# Altium footprint library connectors_socets.pcblib: 601 footprints (part 4 of 38)
Each footprint in its own frame and in the unit in brackets; x right, y up, seen from the top. Pads: shape width x height; smd on the part's side, far side on the other; paste and mask are expansions set on the pad; w line width, h text height; cw(c..) or ccw(c..) is an arc to the next point about the centre after c.
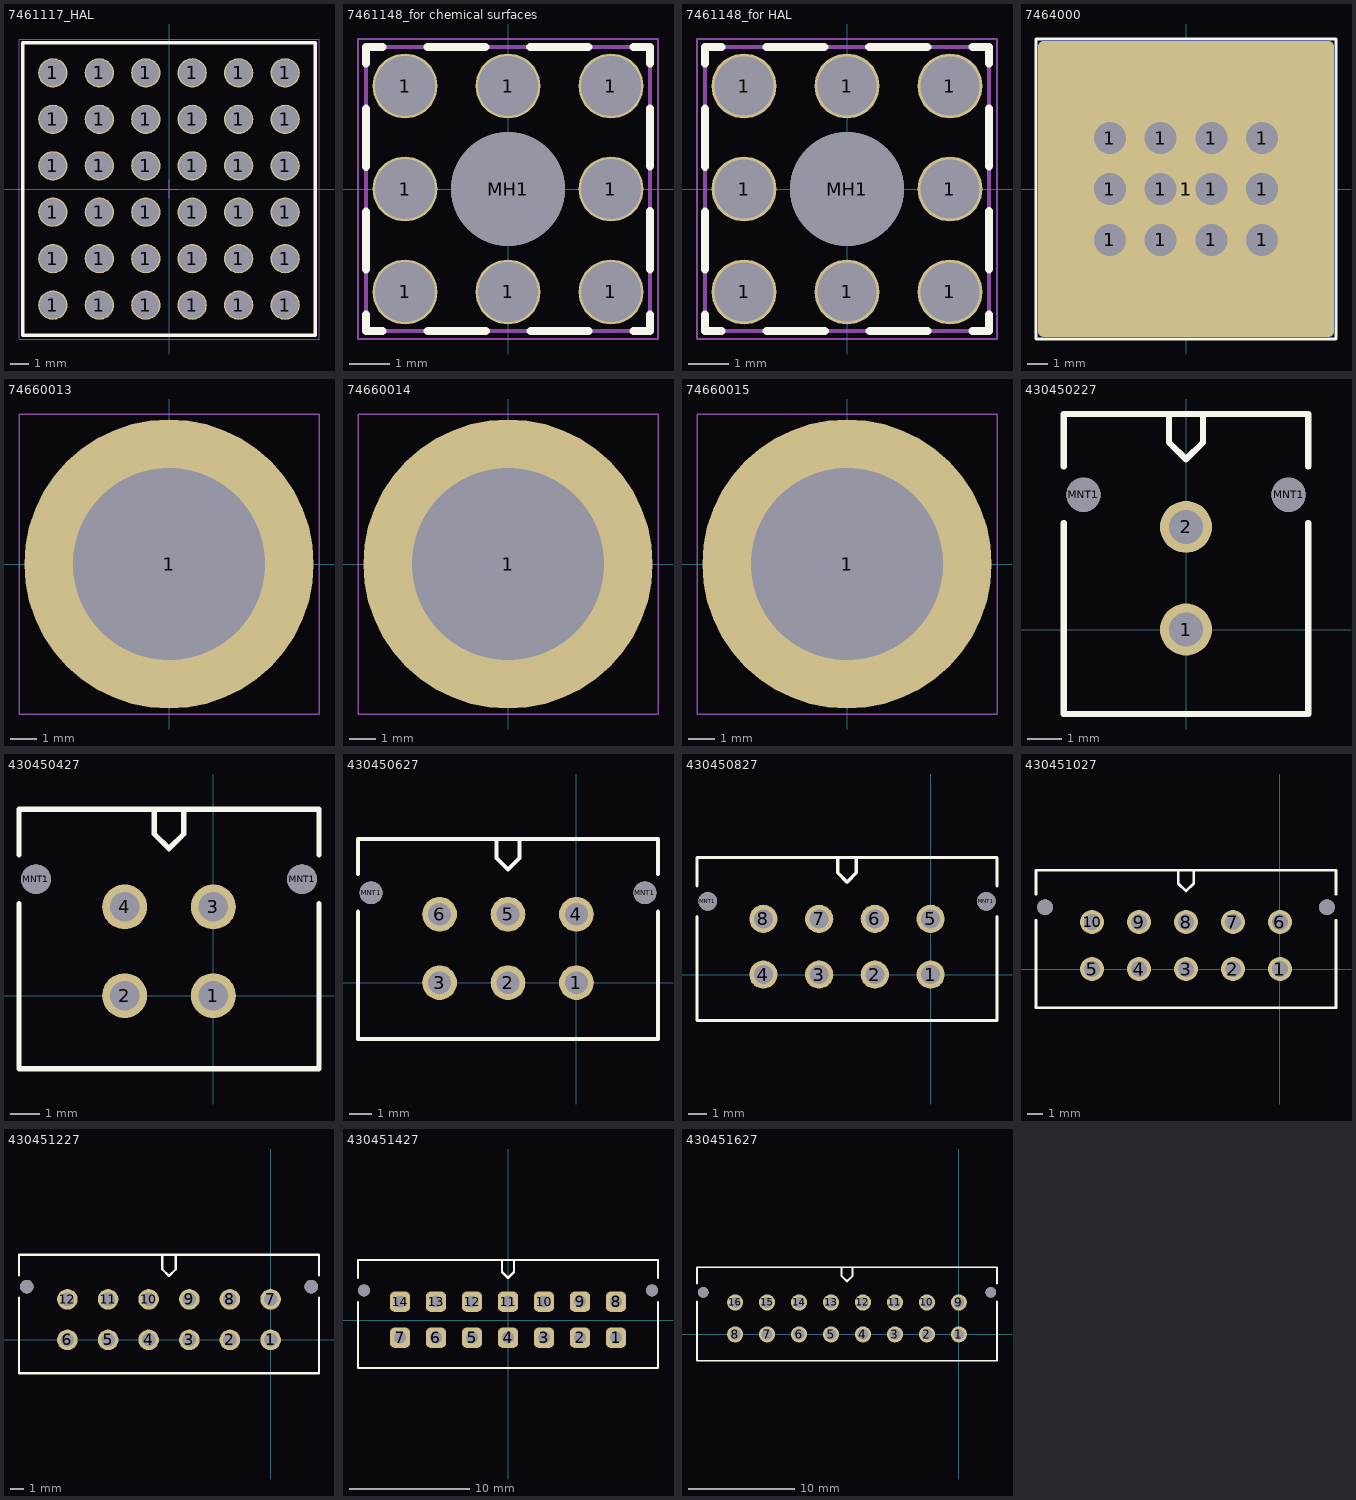
[diagram p3: the footprints below, top view; thin cyan lines are the x and y axes]

## 7461117_HAL [mm] "M10, thr 10mm"
height 25
pads (36):
  round 1.6 hole 1.45: 1(-6.35,-6.35) 1(-6.35,-3.81) 1(-6.35,-1.27) 1(-6.35,1.27) 1(-6.35,3.81) 1(-6.35,6.35) 1(-3.81,-6.35) 1(-3.81,-3.81) 1(-3.81,-1.27) 1(-3.81,1.27) 1(-3.81,3.81) 1(-3.81,6.35) 1(-1.27,-6.35) 1(-1.27,-3.81) 1(-1.27,-1.27) 1(-1.27,1.27) 1(-1.27,3.81) 1(-1.27,6.35) 1(1.27,-6.35) 1(1.27,-3.81) 1(1.27,-1.27) 1(1.27,1.27) 1(1.27,3.81) 1(1.27,6.35) 1(3.81,-6.35) 1(3.81,-3.81) 1(3.81,-1.27) 1(3.81,1.27) 1(3.81,3.81) 1(3.81,6.35) 1(6.35,-6.35) 1(6.35,-3.81) 1(6.35,-1.27) 1(6.35,1.27) 1(6.35,3.81) 1(6.35,6.35)
Top Overlay:
  lines w0.2: -8,-8 8,-8 8,8 -8,8 -8,-8
Mechanical 11:
  lines w0.1: -8,-8 -8,8 8,8 8,-8 -8,-8
  text ".Designator" at -1.75,-0.75 h1.5
Plata3D:
  lines w0.1: -8,-8 -8,8 8,8 8,-8 -8,-8
Board3D:
  lines w0.05: -0.5,0 0.5,0 ; 0,-0.5 0,0.5 ; -8.2,-8.2 8.2,-8.2 8.2,8.2 -8.2,8.2 -8.2,-8.2
3D body "7461117.stp": height 25, standoff -3.5, extent -8,-8 8,8

## 7461148_for chemical surfaces [mm] "M2.5, thr 6mm"
height 6
pads (9):
  round 1.6 hole 1.475: 1(-2.54,-2.54) 1(-2.54,0) 1(-2.54,2.54) 1(0,-2.54) 1(0,2.54) 1(2.54,-2.54) 1(2.54,0) 1(2.54,2.54)
  round 2.8 hole 2.8 unplated: MH1(0,0)
Top Overlay:
  lines w0.2: -3.5,-3.1 -3.5,-3.5 -3.1,-3.5 ; -3.5,-1.99 -3.5,-0.56 ; -3.5,0.55 -3.5,1.98 ; -3.5,3.1 -3.5,3.5 -3.1,3.5 ; -1.99,3.5 -0.56,3.5 ; -1.98,-3.5 -0.55,-3.5 ; 0.55,3.5 1.98,3.5 ; 0.56,-3.5 1.99,-3.5 ; 3.1,-3.5 3.5,-3.5 3.5,-3.1 ; 3.1,3.5 3.5,3.5 3.5,3.1 ; 3.5,-1.98 3.5,-0.55 ; 3.5,0.56 3.5,1.99
Plata3D:
  lines w0.1: -3.5,-3.5 -3.5,3.5 3.5,3.5 3.5,-3.5 -3.5,-3.5
Board3D:
  lines w0.05: -0.5,0 0.5,0 ; 0,-0.5 0,0.5 ; -3.7,-3.7 3.7,-3.7 3.7,3.7 -3.7,3.7 -3.7,-3.7
3D body "7461148.stp": height 6, standoff -3.5, extent -3.5,-3.5 3.5,3.5

## 7461148_for HAL [mm] "M2.5, thr 6mm"
height 6
pads (9):
  round 1.6 hole 1.45: 1(-2.54,-2.54) 1(-2.54,0) 1(-2.54,2.54) 1(0,-2.54) 1(0,2.54) 1(2.54,-2.54) 1(2.54,0) 1(2.54,2.54)
  round 2.8 hole 2.8 unplated: MH1(0,0)
Top Overlay:
  lines w0.2: -3.5,-3.1 -3.5,-3.5 -3.1,-3.5 ; -3.5,-1.99 -3.5,-0.56 ; -3.5,0.55 -3.5,1.98 ; -3.5,3.1 -3.5,3.5 -3.1,3.5 ; -1.99,3.5 -0.56,3.5 ; -1.98,-3.5 -0.55,-3.5 ; 0.55,3.5 1.98,3.5 ; 0.56,-3.5 1.99,-3.5 ; 3.1,-3.5 3.5,-3.5 3.5,-3.1 ; 3.1,3.5 3.5,3.5 3.5,3.1 ; 3.5,-1.98 3.5,-0.55 ; 3.5,0.56 3.5,1.99
Plata3D:
  lines w0.1: -3.5,-3.5 -3.5,3.5 3.5,3.5 3.5,-3.5 -3.5,-3.5
Board3D:
  lines w0.05: -0.5,0 0.5,0 ; 0,-0.5 0,0.5 ; -3.7,-3.7 3.7,-3.7 3.7,3.7 -3.7,3.7 -3.7,-3.7
3D body "7461148.stp": height 6, standoff -3.5, extent -3.5,-3.5 3.5,3.5

## 7464000 [mm]
pads (14):
  round 2 hole 1.6 mask+0.05: 1(-3.81,-2.54) 1(-3.81,0) 1(-3.81,2.54) 1(-1.27,-2.54) 1(-1.27,0) 1(-1.27,2.54) 1(1.27,-2.54) 1(1.27,0) 1(1.27,2.54) 1(3.81,-2.54) 1(3.81,0) 1(3.81,2.54)
  rrect4% 14.8x14.8 smd mask-2.3: 1(0,0)
  rrect4% 14.8x14.8 smd far side mask+0.05: 1(0,0)
Top Overlay:
  lines w0.15: -7.5,-7.5 7.5,-7.5 7.5,7.5 -7.5,7.5 -7.5,-7.5
3D body "7464000 (rev1).stp": height 18.1, standoff -3.5, extent -7.385,-7.385 7.385,7.385

## 0039290043@MOLEX [mm]

## 74660013 [mm] "Bush SMD open"
height 3
pads (1):
  round 11 / inner round 0 / far side round 0 hole 7.3 unplated: 1(0,0)
Top Paste:
  region: 0.5,5.377 0.811,5.348 1.421,5.219 2.013,5.02 2.578,4.755 3.109,4.427 3.598,4.039 4.039,3.598 4.427,3.109 4.755,2.578 5.02,2.013 5.219,1.421 5.348,0.811 5.377,0.5 3.716,0.5 3.663,0.801 3.485,1.384 3.214,1.931 2.859,2.427 2.427,2.859 1.931,3.214 1.385,3.485 0.801,3.663 0.5,3.716
  region: 5.377,-0.5 5.348,-0.811 5.219,-1.421 5.02,-2.013 4.755,-2.578 4.427,-3.109 4.039,-3.598 3.598,-4.039 3.109,-4.427 2.578,-4.755 2.013,-5.02 1.421,-5.219 0.811,-5.348 0.5,-5.377 0.5,-3.716 0.801,-3.663 1.384,-3.485 1.931,-3.214 2.427,-2.859 2.859,-2.427 3.214,-1.931 3.485,-1.385 3.663,-0.801 3.716,-0.5
  region: -0.5,-5.377 -0.811,-5.348 -1.421,-5.219 -2.013,-5.02 -2.578,-4.755 -3.109,-4.427 -3.598,-4.039 -4.039,-3.598 -4.427,-3.109 -4.755,-2.578 -5.02,-2.013 -5.219,-1.421 -5.348,-0.811 -5.377,-0.5 -3.716,-0.5 -3.663,-0.801 -3.485,-1.384 -3.214,-1.931 -2.859,-2.427 -2.427,-2.859 -1.931,-3.214 -1.385,-3.485 -0.801,-3.663 -0.5,-3.716
  region: -5.377,0.5 -5.348,0.811 -5.219,1.421 -5.02,2.013 -4.755,2.578 -4.427,3.109 -4.039,3.598 -3.598,4.039 -3.109,4.427 -2.578,4.755 -2.013,5.02 -1.421,5.219 -0.811,5.348 -0.5,5.377 -0.5,3.716 -0.801,3.663 -1.384,3.485 -1.931,3.214 -2.427,2.859 -2.859,2.427 -3.214,1.931 -3.485,1.385 -3.663,0.801 -3.716,0.5
Plata3D:
  circle w0.1: c0,0 r5
Board3D:
  lines w0.05: -0.5,0 0.5,0 ; 0,-0.5 0,0.5 ; -5.7,-5.7 5.7,-5.7 5.7,5.7 -5.7,5.7 -5.7,-5.7
3D body "74660013.stp": height 3, standoff -2.6, extent -5,-5 5,5

## 74660014 [mm] "Bush SMD open"
height 3
pads (1):
  round 11 / inner round 0 / far side round 0 hole 7.3 unplated: 1(0,0)
Top Paste:
  region: 0.5,5.377 0.811,5.348 1.421,5.219 2.013,5.02 2.578,4.755 3.109,4.427 3.598,4.039 4.039,3.598 4.427,3.109 4.755,2.578 5.02,2.013 5.219,1.421 5.348,0.811 5.377,0.5 3.717,0.5 3.664,0.801 3.485,1.384 3.214,1.931 2.859,2.427 2.427,2.859 1.931,3.214 1.384,3.485 0.801,3.664 0.5,3.717
  region: -5.377,0.5 -5.348,0.811 -5.219,1.421 -5.02,2.013 -4.755,2.578 -4.427,3.109 -4.039,3.598 -3.598,4.039 -3.109,4.427 -2.578,4.755 -2.013,5.02 -1.421,5.219 -0.811,5.348 -0.5,5.377 -0.5,3.717 -0.801,3.664 -1.384,3.485 -1.931,3.214 -2.427,2.859 -2.859,2.427 -3.214,1.931 -3.485,1.384 -3.664,0.801 -3.717,0.5
  region: -0.5,-5.377 -0.811,-5.348 -1.421,-5.219 -2.013,-5.02 -2.578,-4.755 -3.109,-4.427 -3.598,-4.039 -4.039,-3.598 -4.427,-3.109 -4.755,-2.578 -5.02,-2.013 -5.219,-1.421 -5.348,-0.811 -5.377,-0.5 -3.717,-0.5 -3.664,-0.801 -3.485,-1.384 -3.214,-1.931 -2.859,-2.427 -2.427,-2.859 -1.931,-3.214 -1.384,-3.485 -0.801,-3.664 -0.5,-3.717
  region: 5.377,-0.5 5.348,-0.811 5.219,-1.421 5.02,-2.013 4.755,-2.578 4.427,-3.109 4.039,-3.598 3.598,-4.039 3.109,-4.427 2.578,-4.755 2.013,-5.02 1.421,-5.219 0.811,-5.348 0.5,-5.377 0.5,-3.717 0.801,-3.664 1.384,-3.485 1.931,-3.214 2.427,-2.859 2.859,-2.427 3.214,-1.931 3.485,-1.384 3.664,-0.801 3.717,-0.5
Plata3D:
  circle w0.1: c0,0 r5
Board3D:
  lines w0.05: -0.5,0 0.5,0 ; 0,-0.5 0,0.5 ; -5.7,-5.7 5.7,-5.7 5.7,5.7 -5.7,5.7 -5.7,-5.7
3D body "74660014.stp": height 3, standoff -2.6, extent -5,-5 5,5

## 74660015 [mm] "Bush SMD open"
height 3
pads (1):
  round 11 / inner round 0 / far side round 0 hole 7.3 unplated: 1(0,0)
Top Paste:
  region: 0.5,5.377 0.5,3.716 0.501,3.716 0.801,3.663 1.385,3.485 1.931,3.214 2.427,2.859 2.859,2.427 3.214,1.931 3.485,1.385 3.663,0.801 3.716,0.501 3.716,0.5 5.377,0.5 5.348,0.811 5.219,1.421 5.02,2.013 4.755,2.578 4.427,3.108 4.039,3.598 3.598,4.039 3.108,4.426 2.578,4.755 2.013,5.02 1.421,5.219 0.811,5.348
  region: 5.377,-0.5 3.716,-0.5 3.716,-0.501 3.663,-0.801 3.485,-1.385 3.214,-1.931 2.859,-2.427 2.427,-2.859 1.931,-3.214 1.385,-3.485 0.801,-3.663 0.501,-3.716 0.5,-3.716 0.5,-5.377 0.811,-5.348 1.421,-5.219 2.013,-5.02 2.578,-4.755 3.108,-4.427 3.598,-4.039 4.039,-3.598 4.426,-3.108 4.755,-2.578 5.02,-2.013 5.219,-1.421 5.348,-0.811
  region: -0.5,-5.377 -0.5,-3.716 -0.501,-3.716 -0.801,-3.663 -1.385,-3.485 -1.931,-3.214 -2.427,-2.859 -2.859,-2.427 -3.214,-1.931 -3.485,-1.385 -3.663,-0.801 -3.716,-0.501 -3.716,-0.5 -5.377,-0.5 -5.348,-0.811 -5.219,-1.421 -5.02,-2.013 -4.755,-2.578 -4.427,-3.108 -4.039,-3.598 -3.598,-4.039 -3.108,-4.426 -2.578,-4.755 -2.013,-5.02 -1.421,-5.219 -0.811,-5.348
  region: -5.377,0.5 -3.716,0.5 -3.716,0.501 -3.663,0.801 -3.485,1.385 -3.214,1.931 -2.859,2.427 -2.427,2.859 -1.931,3.214 -1.385,3.485 -0.801,3.663 -0.501,3.716 -0.5,3.716 -0.5,5.377 -0.811,5.348 -1.421,5.219 -2.013,5.02 -2.578,4.755 -3.108,4.427 -3.598,4.039 -4.039,3.598 -4.426,3.108 -4.755,2.578 -5.02,2.013 -5.219,1.421 -5.348,0.811
Plata3D:
  circle w0.1: c0,0 r5
Board3D:
  lines w0.05: -0.5,0 0.5,0 ; 0,-0.5 0,0.5 ; -5.7,-5.7 -5.7,5.7 5.7,5.7 5.7,-5.7 -5.7,-5.7
3D body "74660015.stp": height 3, standoff -2.6, extent -5,-5 5,5

## 430450227 [mm]
height 9.91
pads (4):
  round 1.52 hole 1 mask+0.076: 1(0,0) 2(0,3)
  round 1 hole 1 unplated: MNT1(-3,3.94) MNT1(3,3.94)
Top Overlay:
  lines w0.18: -3.575,3.11 -3.575,-2.47 3.575,-2.47 3.575,3.11 ; -3.575,4.77 -3.575,6.3 3.575,6.3 3.575,4.77 ; -0.5,6.3 -0.5,5.47 0,4.97 0.5,5.47 0.5,6.3
3D body "430450227--3DModel-STEP-56544.STEP": height 9.91, standoff -3.18, extent -3.575,-2.47 3.575,6.3

## 430450427 [mm]
height 9.91
pads (6):
  round 1.52 hole 1 mask+0.076: 1(0,0) 2(-3,0) 3(0,3) 4(-3,3)
  round 1 hole 1 unplated: MNT1(-6,3.94) MNT1(3,3.94)
Top Overlay:
  lines w0.18: -6.575,3.11 -6.575,-2.47 3.575,-2.47 3.575,3.11 ; -6.575,4.77 -6.575,6.3 3.575,6.3 3.575,4.77 ; -2,6.3 -2,5.47 -1.5,4.97 -1,5.47 -1,6.3
3D body "430450427--3DModel-STEP-56544.STEP": height 9.91, standoff -3.18, extent -6.575,-2.47 3.575,6.3

## 430450627 [mm]
height 9.91
pads (8):
  round 1.52 hole 1 mask+0.076: 1(0,0) 2(-3,0) 3(-6,0) 4(0,3) 5(-3,3) 6(-6,3)
  round 1 hole 1 unplated: MNT1(-9,3.94) MNT1(3,3.94)
Top Overlay:
  lines w0.18: -9.575,3.11 -9.575,-2.47 3.575,-2.47 3.575,3.11 ; -9.575,4.77 -9.575,6.3 3.575,6.3 3.575,4.77 ; -3.5,6.3 -3.5,5.47 -3,4.97 -2.5,5.47 -2.5,6.3
3D body "430450627--3DModel-STEP-56544.STEP": height 9.91, standoff -3.18, extent -9.575,-2.47 3.575,6.3

## 430450827 [mm]
height 9.91
pads (10):
  round 1.52 hole 1.02 mask+0.076: 1(0,0) 2(-3,0) 3(-6,0) 4(-9,0) 5(0,3) 6(-3,3) 7(-6,3) 8(-9,3)
  round 1 hole 1 unplated: MNT1(-12,3.94) MNT1(3,3.94)
Top Overlay:
  lines w0.18: -12.575,3.11 -12.575,-2.47 3.575,-2.47 3.575,3.11 ; -12.575,4.77 -12.575,6.3 3.575,6.3 3.575,4.77 ; -5,6.3 -5,5.47 -4.5,4.97 -4,5.47 -4,6.3
3D body "430450827--3DModel-STEP-56544.STEP": height 9.91, standoff -3.18, extent -12.575,-2.47 3.575,6.3

## 430451027 [mm]
height 9.91
pads (12):
  round 1.52 hole 1 mask+0.076: 1(0,0) 2(-3,0) 3(-6,0) 4(-9,0) 5(-12,0) 6(0,3) 7(-3,3) 8(-6,3) 9(-9,3) 10(-12,3)
  round 1 hole 1 unplated: MNT1(-15,3.94) MNT1(3,3.94)
Top Overlay:
  lines w0.18: -15.575,3.11 -15.575,-2.47 3.575,-2.47 3.575,3.11 ; -15.575,4.77 -15.575,6.3 3.575,6.3 3.575,4.77 ; -6.5,6.3 -6.5,5.47 -6,4.97 -5.5,5.47 -5.5,6.3
3D body "430451027.stp": height 9.95, standoff -3.14, extent -15.575,-2.44 3.575,6.33

## 430451227 [mm]
height 9.91
pads (14):
  round 1.52 hole 1 mask+0.076: 1(0,0) 2(-3,0) 3(-6,0) 4(-9,0) 5(-12,0) 6(-15,0) 7(0,3) 8(-3,3) 9(-6,3) 10(-9,3) 11(-12,3) 12(-15,3)
  round 1 hole 1 unplated: MNT1(-18,3.94) MNT1(3,3.94)
Top Overlay:
  lines w0.18: -18.575,3.11 -18.575,-2.47 3.575,-2.47 3.575,3.11 ; -18.575,4.77 -18.575,6.3 3.575,6.3 3.575,4.77 ; -8,6.22 -8,5.22 -7.5,4.72 -7,5.22 -7,6.22
3D body "430451227--3DModel-STEP-56544.STEP": height 9.91, standoff -3.18, extent -18.575,-2.47 3.575,6.3

## 430451427 [mm]
pads (16):
  rrect50% 1.7x1.7 hole 1: 1(9,-1.47) 2(6,-1.47) 3(3,-1.47) 4(0,-1.47) 5(-3,-1.47) 6(-6,-1.47) 7(-9,-1.47) 8(9,1.53) 9(6,1.53) 10(3,1.53) 11(0,1.53) 12(-3,1.53) 13(-6,1.53) 14(-9,1.53)
  round 1 hole 1 unplated: MNT1(12,2.47) MNT2(-12,2.47)
Top Overlay:
  lines w0.18: -12.5,1.5 -12.5,-4 12.5,-4 12.5,1.5 ; -12.5,3.5 -12.5,5 12.5,5 12.5,3.5 ; -0.5,5 -0.5,4 0,3.5 0.5,4 0.5,5
3D body "430451427.stp": height 9.95, standoff -3.14, extent -12.575,-3.94 12.575,4.83

## 430451627 [mm]
height 9.91
pads (18):
  round 1.52 hole 1 mask+0.076: 1(0,0) 2(-3,0) 3(-6,0) 4(-9,0) 5(-12,0) 6(-15,0) 7(-18,0) 8(-21,0) 9(0,3) 10(-3,3) 11(-6,3) 12(-9,3) 13(-12,3) 14(-15,3) 15(-18,3) 16(-21,3)
  round 1 hole 1 unplated: MNT1(-24,3.94) MNT1(3,3.94)
Top Overlay:
  lines w0.18: -24.575,3.11 -24.575,-2.47 3.575,-2.47 3.575,3.11 ; -24.575,4.77 -24.575,6.3 3.575,6.3 3.575,4.77 ; -11,6.3 -11,5.47 -10.5,4.97 -10,5.47 -10,6.3
3D body "430451627--3DModel-STEP-56544.STEP": height 9.91, standoff -3.18, extent -24.575,-2.47 3.575,6.3